# Altium footprint library self_pcblib v1.8.6.PcbLib: 123 footprints (part 6 of 8)
Each footprint in its own frame and in the unit in brackets; x right, y up, seen from the top. Pads: shape width x height; smd on the part's side, far side on the other; paste and mask are expansions set on the pad; w line width, h text height; cw(c..) or ccw(c..) is an arc to the next point about the centre after c.
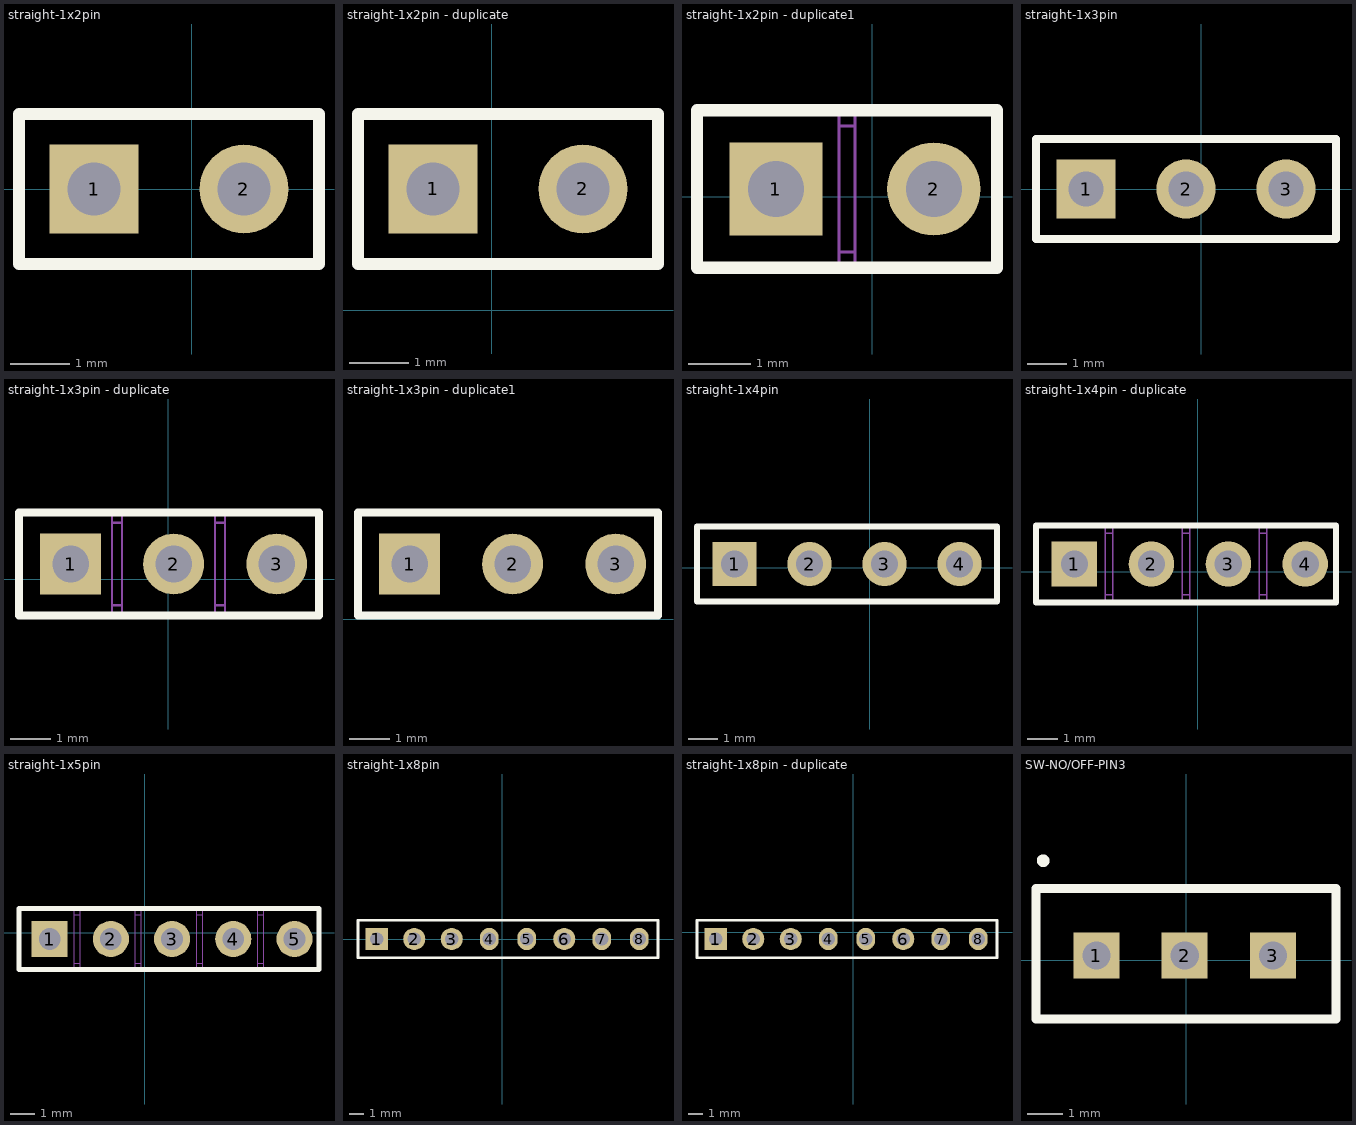
[diagram p5: the footprints below, top view; thin cyan lines are the x and y axes]

## straight-1x2pin [mm]
pads (2):
  rect 1.5x1.5 hole 0.9: 1(-1.651,0)
  round 1.5 hole 0.9: 2(0.889,0)
Top Overlay:
  lines w0.2: -2.921,-1.27 -2.921,1.27 2.159,1.27 2.159,-1.27 -2.921,-1.27
3D body "1001-2.STEP": height 8.54, standoff -3, extent -2.921,-1.27 2.159,1.27

## straight-1x2pin - duplicate [mm]
pads (2):
  rect 1.5x1.5 hole 0.9: 1(-0.991,2.057)
  round 1.5 hole 0.9: 2(1.549,2.057)
Top Overlay:
  lines w0.2: -2.261,0.787 2.819,0.787 2.819,3.327 -2.261,3.327 -2.261,0.787
3D body "User Library-1x2 TH Pitch 2_54mm.STEP": height 9.5, standoff -3.2, extent -2.21,0.737 2.87,3.277

## straight-1x2pin - duplicate1 [mm]
pads (2):
  rect 1.5x1.5 hole 0.9: 1(-1.549,0.127)
  round 1.5 hole 0.9: 2(0.991,0.127)
Top Overlay:
  lines w0.2: -2.819,-1.143 2.007,-1.143 2.007,1.397 -0.914,1.397 -2.819,1.397 -2.819,-1.143
Mechanical 1:
  lines w0.05: -0.533,-0.889 -0.279,-0.889 ; -0.533,1.143 -0.279,1.143 ; -2.819,-1.143 -2.819,1.397 -0.533,1.397 -0.533,-1.143 -2.819,-1.143 ; -0.279,-1.143 2.007,-1.143 2.007,1.397 -0.279,1.397 -0.279,-1.143
3D body: height 4, standoff 0, extent -1.896,-0.222 -1.199,0.477
3D body: height 4, standoff 0, extent 0.644,-0.222 1.341,0.477
3D body: height 4, standoff 0, extent 0.644,-0.222 1.341,0.477
3D body: height 4, standoff 0, extent -1.897,-0.222 -1.199,0.476
3D body: height 1.5, standoff 0.2, extent -0.533,-0.889 -0.279,1.143
3D body: height 1.7, standoff 0.2, extent -0.279,-1.143 2.007,1.397
3D body: height 1.7, standoff 0.2, extent -2.819,-1.143 -0.533,1.397

## straight-1x3pin [mm]
pads (3):
  rect 1.5x1.5 hole 0.9: 1(-2.921,0)
  round 1.5 hole 0.9: 2(-0.381,0) 3(2.159,0)
Top Overlay:
  lines w0.2: -4.191,-1.27 -4.191,1.27 3.429,1.27 3.429,-1.27 -4.191,-1.27
3D body "1001-3.STEP": height 8.54, standoff -3, extent -4.191,-1.27 3.429,1.27

## straight-1x3pin - duplicate [mm]
pads (3):
  rect 1.5x1.5 hole 0.9: 1(-2.413,0.381)
  round 1.5 hole 0.9: 2(0.127,0.381) 3(2.667,0.381)
Top Overlay:
  lines w0.2: -3.683,-0.889 3.708,-0.889 3.708,1.651 -1.778,1.651 -3.683,1.651 -3.683,-0.889
Mechanical 1:
  lines w0.05: -1.397,-0.635 -1.143,-0.635 ; -1.397,1.397 -1.143,1.397 ; 1.143,-0.635 1.397,-0.635 ; 1.143,1.397 1.397,1.397 ; -3.683,-0.889 -3.683,1.651 -1.397,1.651 -1.397,-0.889 -3.683,-0.889 ; -1.143,-0.889 1.143,-0.889 1.143,1.651 -1.143,1.651 -1.143,-0.889 ; 1.397,-0.889 3.683,-0.889 3.683,1.651 1.397,1.651 1.397,-0.889
3D body: height 4, standoff 0, extent -2.76,0.032 -2.063,0.731
3D body: height 4, standoff 0, extent -0.22,0.032 0.477,0.731
3D body: height 4, standoff 0, extent 2.32,0.032 3.017,0.731
3D body: height 4, standoff 0, extent 2.32,0.032 3.017,0.731
3D body: height 4, standoff 0, extent -0.22,0.032 0.477,0.731
3D body: height 4, standoff 0, extent -2.76,0.032 -2.063,0.73
3D body: height 1.5, standoff 0.2, extent 1.143,-0.635 1.397,1.397
3D body: height 1.5, standoff 0.2, extent -1.397,-0.635 -1.143,1.397
3D body: height 1.7, standoff 0.2, extent 1.397,-0.889 3.683,1.651
3D body: height 1.7, standoff 0.2, extent -1.143,-0.889 1.143,1.651
3D body: height 1.7, standoff 0.2, extent -3.683,-0.889 -1.397,1.651

## straight-1x3pin - duplicate1 [mm]
pads (3):
  rect 1.5x1.5 hole 0.9: 1(-9.266,1.365)
  round 1.5 hole 0.9: 2(-6.726,1.365) 3(-4.186,1.365)
Top Overlay:
  lines w0.2: -10.536,0.095 -10.536,2.635 -8.631,2.635 -3.144,2.635 -3.144,0.095 -10.536,0.095
Mechanical 1:
  lines w0.05: -8.25,0.095 -10.536,0.095 -10.536,2.635 -8.25,2.635 ; -7.996,0.095 -5.71,0.095 ; -7.996,2.635 -5.71,2.635 ; -5.456,0.095 -3.17,0.095 -3.17,2.635 -5.456,2.635
3D body "User Library-1x3 TH Pitch 2_54mm.STEP": height 9.5, standoff -3.2, extent -10.668,0.095 -3.048,2.635

## straight-1x4pin [mm]
pads (4):
  rect 1.5x1.5 hole 0.9: 1(-4.572,0.127)
  round 1.5 hole 0.9: 2(-2.032,0.127) 3(0.508,0.127) 4(3.048,0.127)
Top Overlay:
  lines w0.2: -5.842,-1.143 4.318,-1.143 4.318,1.397 -5.842,1.397 -5.842,-1.143
3D body "1001-4.STEP": height 8.54, standoff -3, extent -5.842,-1.143 4.318,1.397

## straight-1x4pin - duplicate [mm]
pads (4):
  rect 1.5x1.5 hole 0.9: 1(-4.064,0.254)
  round 1.5 hole 0.9: 2(-1.524,0.254) 3(1.016,0.254) 4(3.556,0.254)
Top Overlay:
  lines w0.2: -5.334,-1.016 4.572,-1.016 4.572,1.524 -3.429,1.524 -5.334,1.524 -5.334,-1.016
Mechanical 1:
  lines w0.05: -3.048,-0.762 -2.794,-0.762 ; -3.048,1.27 -2.794,1.27 ; -0.508,-0.762 -0.254,-0.762 ; -0.508,1.27 -0.254,1.27 ; 2.032,-0.762 2.286,-0.762 ; 2.032,1.27 2.286,1.27 ; -5.334,-1.016 -5.334,1.524 -3.048,1.524 -3.048,-1.016 -5.334,-1.016 ; -2.794,-1.016 -0.508,-1.016 -0.508,1.524 -2.794,1.524 -2.794,-1.016 ; -0.254,-1.016 2.032,-1.016 2.032,1.524 -0.254,1.524 -0.254,-1.016 ; 2.286,-1.016 4.572,-1.016 4.572,1.524 2.286,1.524 2.286,-1.016
3D body: height 4, standoff 0, extent -4.411,-0.095 -3.714,0.604
3D body: height 4, standoff 0, extent -1.871,-0.095 -1.174,0.604
3D body: height 4, standoff 0, extent 0.669,-0.095 1.366,0.604
3D body: height 4, standoff 0, extent 3.209,-0.095 3.906,0.604
3D body: height 4, standoff 0, extent 3.209,-0.095 3.906,0.604
3D body: height 4, standoff 0, extent 0.669,-0.095 1.366,0.604
3D body: height 4, standoff 0, extent -1.871,-0.095 -1.174,0.604
3D body: height 4, standoff 0, extent -4.411,-0.095 -3.714,0.603
3D body: height 1.5, standoff 0.2, extent 2.032,-0.762 2.286,1.27
3D body: height 1.5, standoff 0.2, extent -0.508,-0.762 -0.254,1.27
3D body: height 1.5, standoff 0.2, extent -3.048,-0.762 -2.794,1.27
3D body: height 1.7, standoff 0.2, extent 2.286,-1.016 4.572,1.524
3D body: height 1.7, standoff 0.2, extent -0.254,-1.016 2.032,1.524
3D body: height 1.7, standoff 0.2, extent -2.794,-1.016 -0.508,1.524
3D body: height 1.7, standoff 0.2, extent -5.334,-1.016 -3.048,1.524

## straight-1x5pin [mm]
pads (5):
  rect 1.5x1.5 hole 0.9: 1(-3.937,-0.254)
  round 1.5 hole 0.9: 2(-1.397,-0.254) 3(1.143,-0.254) 4(3.683,-0.254) 5(6.223,-0.254)
Top Overlay:
  lines w0.2: -5.207,-1.524 7.239,-1.524 7.239,1.016 -3.302,1.016 -5.207,1.016 -5.207,-1.524
Mechanical 1:
  lines w0.05: -2.921,-1.27 -2.667,-1.27 ; -2.921,0.762 -2.667,0.762 ; -0.381,-1.27 -0.127,-1.27 ; -0.381,0.762 -0.127,0.762 ; 2.159,-1.27 2.413,-1.27 ; 2.159,0.762 2.413,0.762 ; 4.699,-1.27 4.953,-1.27 ; 4.699,0.762 4.953,0.762 ; 7.239,-1.524 4.953,-1.524 4.953,1.016 7.239,1.016 ; -5.207,-1.524 -5.207,1.016 -2.921,1.016 -2.921,-1.524 -5.207,-1.524 ; -2.667,-1.524 -0.381,-1.524 -0.381,1.016 -2.667,1.016 -2.667,-1.524 ; -0.127,-1.524 2.159,-1.524 2.159,1.016 -0.127,1.016 -0.127,-1.524 ; 2.413,-1.524 4.699,-1.524 4.699,1.016 2.413,1.016 2.413,-1.524
3D body: height 4, standoff 0, extent -4.284,-0.603 -3.587,0.096
3D body: height 4, standoff 0, extent -1.744,-0.603 -1.047,0.096
3D body: height 4, standoff 0, extent 0.796,-0.603 1.493,0.096
3D body: height 4, standoff 0, extent 3.336,-0.603 4.033,0.096
3D body: height 4, standoff 0, extent 5.876,-0.603 6.573,0.095
3D body: height 4, standoff 0, extent 5.876,-0.603 6.573,0.096
3D body: height 4, standoff 0, extent 3.336,-0.603 4.033,0.096
3D body: height 4, standoff 0, extent 0.796,-0.603 1.493,0.096
3D body: height 4, standoff 0, extent -1.744,-0.603 -1.047,0.096
3D body: height 4, standoff 0, extent -4.284,-0.603 -3.587,0.095
3D body: height 1.5, standoff 0.2, extent 4.699,-1.27 4.953,0.762
3D body: height 1.5, standoff 0.2, extent 2.159,-1.27 2.413,0.762
3D body: height 1.5, standoff 0.2, extent -0.381,-1.27 -0.127,0.762
3D body: height 1.5, standoff 0.2, extent -2.921,-1.27 -2.667,0.762
3D body: height 1.7, standoff 0.2, extent 4.953,-1.524 7.239,1.016
3D body: height 1.7, standoff 0.2, extent 2.413,-1.524 4.699,1.016
3D body: height 1.7, standoff 0.2, extent -0.127,-1.524 2.159,1.016
3D body: height 1.7, standoff 0.2, extent -2.667,-1.524 -0.381,1.016
3D body: height 1.7, standoff 0.2, extent -5.207,-1.524 -2.921,1.016

## straight-1x8pin [mm]
pads (8):
  rect 1.5x1.5 hole 0.9: 1(-8.509,0)
  round 1.5 hole 0.9: 2(-5.969,0) 3(-3.429,0) 6(4.191,0)
  oval 1.27x1.5 hole 0.9: 4(-0.889,0) 5(1.651,0) 7(6.731,0) 8(9.271,0)
Top Overlay:
  lines w0.2: -9.779,-1.27 10.541,-1.27 10.541,1.27 -9.779,1.27 -9.779,-1.27
3D body "8 pin strip.STEP": height 0.7, standoff -10.9, extent -9.779,-1.27 10.541,1.27

## straight-1x8pin - duplicate [mm]
pads (8):
  rect 1.5x1.5 hole 0.9: 1(-9.296,-0.457)
  round 1.5 hole 0.9: 2(-6.756,-0.457) 3(-4.216,-0.457) 6(3.404,-0.457)
  oval 1.27x1.5 hole 0.9: 4(-1.676,-0.457) 5(0.864,-0.457) 7(5.944,-0.457) 8(8.484,-0.457)
Top Overlay:
  lines w0.2: -10.566,-1.727 9.754,-1.727 9.754,0.813 -10.566,0.813 -10.566,-1.727
3D body "65793.stp": height 7.27, standoff -4.27, extent -10.643,-1.753 9.677,0.787

## straight-2x2pin [mm]

## straight-2x3pin [mm]

## straight-2x4pin [mm]

## straight-2x5pin [mm]

## SW-NO/OFF-PIN3 [mm]
pads (3):
  rect 1.3x1.3 hole 0.8: 1(-2.547,0.126) 2(-0.047,0.126) 3(2.453,0.126)
Top Overlay:
  circle w0.254: c-4.057,2.814 r0.051
  lines w0.254: -4.26,-1.673 -4.26,2.027 4.24,2.027 4.24,-1.673 -4.26,-1.673
3D body "SW-No_OFF.step": height 4.32, standoff -9.73, extent -5.39,-2.672 5.608,2.916